# Altium footprint library LED.PcbLib: 60 footprints (part 3 of 4)
Each footprint in its own frame and in the unit in brackets; x right, y up, seen from the top. Pads: shape width x height; smd on the part's side, far side on the other; paste and mask are expansions set on the pad; w line width, h text height; cw(c..) or ccw(c..) is an arc to the next point about the centre after c.
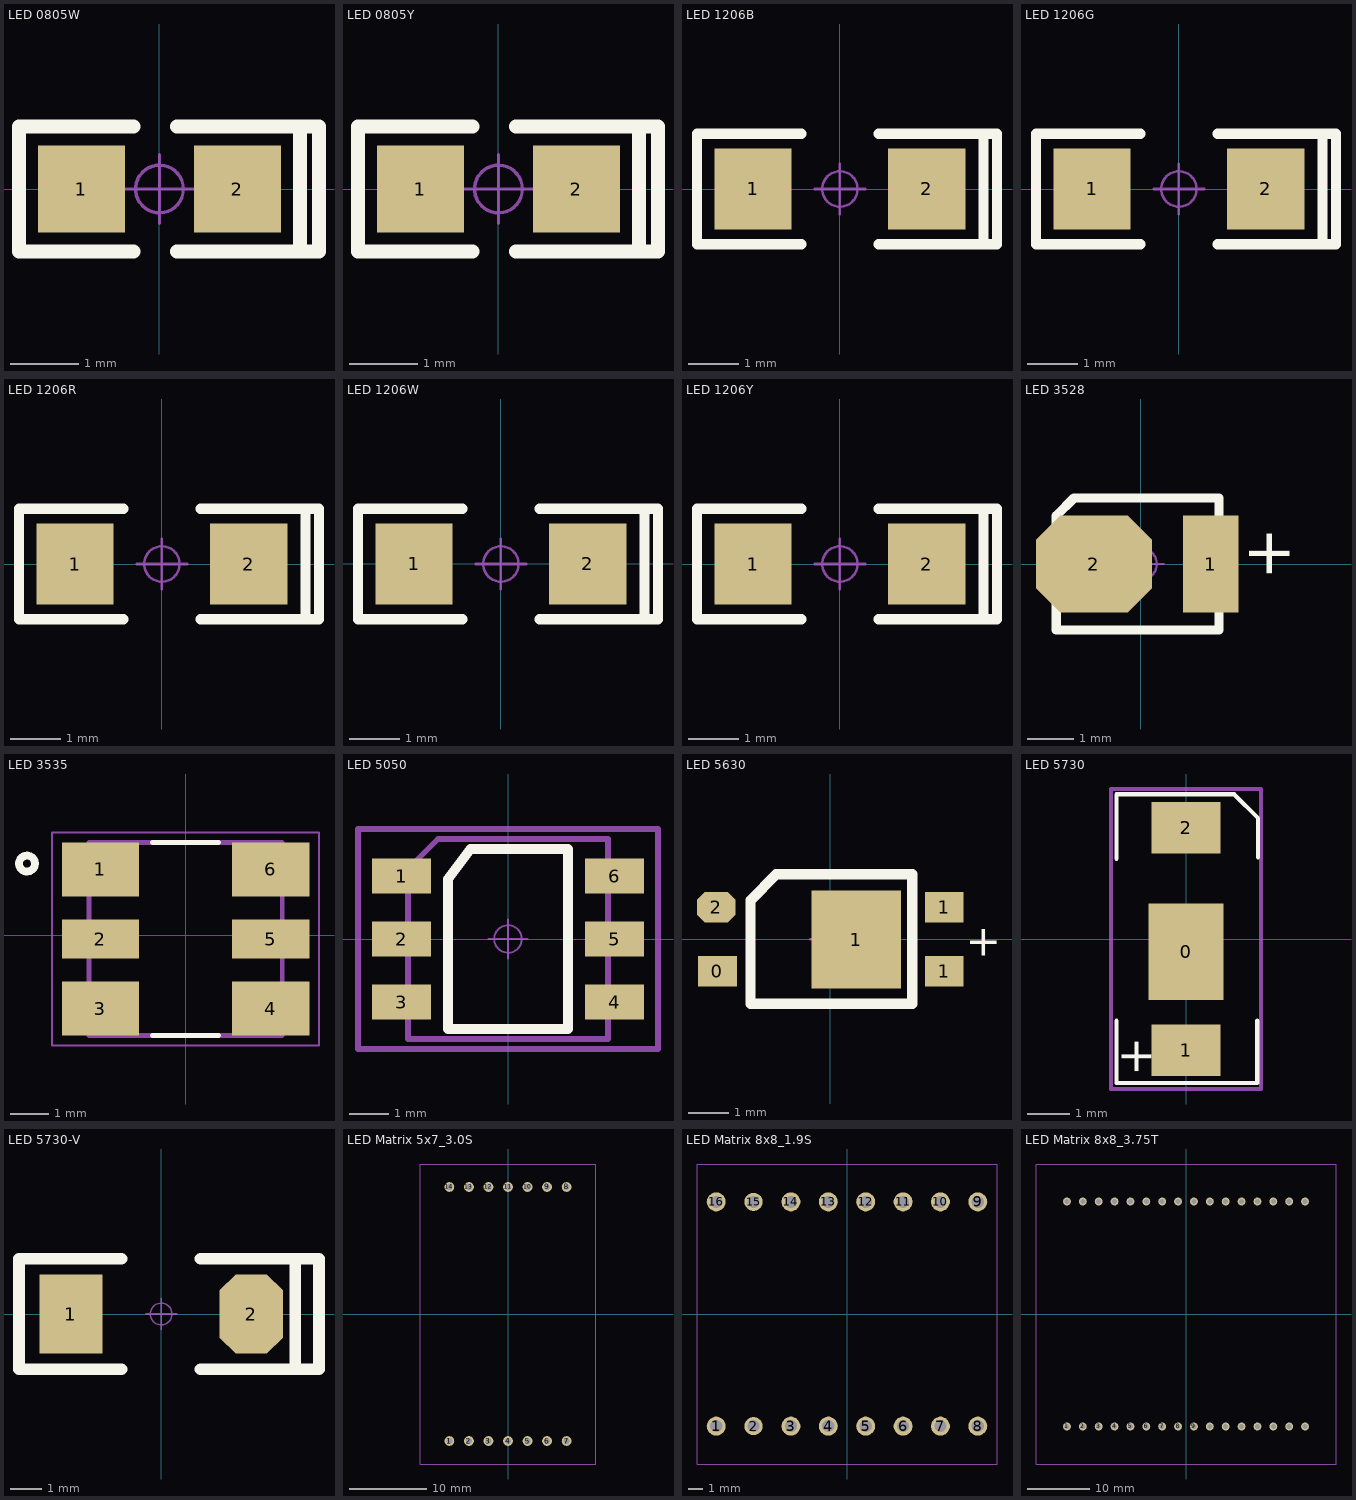
[diagram p2: the footprints below, top view; thin cyan lines are the x and y axes]

## LED 0805W [mil] "ï¿½ï¿½É«0805LED"
pads (2):
  rect 50x50 smd: 1(-45,0) 2(45,0)
Top Overlay:
  lines w8: -15,-36 -81,-36 -81,36 -15,36 ; 10.01,-35.99 80.01,-35.99 ; 10.01,36.01 80.01,36.01 ; 76.01,-35.99 92.01,-35.99 92.01,36.01 76.01,36.01 ; 81.01,-35.99 81.01,36.01
Mechanical 15:
  circle w1.97: c0,0 r13.78
  lines w1.97: -19.68,0 19.68,0 ; 0,-19.68 0,19.68
3D body "LED 0805������.STEP": height 31.69, standoff 12.01, extent -29.49,-24.65 29.49,24.65
3D body "LED 0805-W.STEP": height 26.33, standoff -0.16, extent -39.37,-24.65 39.37,24.64

## LED 0805Y [mil] "ï¿½ï¿½É«0805LED"
pads (2):
  rect 50x50 smd: 1(-45,0) 2(45,0)
Top Overlay:
  lines w8: -15,-36 -81,-36 -81,36 -15,36 ; 10,-36 80,-36 ; 10,36 80,36 ; 76,-36 92,-36 92,36 76,36 ; 81.01,-35.99 81.01,36.01
Mechanical 15:
  circle w1.97: c0,0 r13.78
  lines w1.97: -19.68,0 19.68,0 ; 0,-19.68 0,19.68
3D body "LED 0805������.STEP": height 31.69, standoff 12.01, extent -29.49,-24.65 29.49,24.65
3D body "LED 0805-Y.STEP": height 26.33, standoff -0.16, extent -39.37,-24.65 39.37,24.65

## LED 1206B [mil] "ï¿½ï¿½É«1206LED"
pads (2):
  rect 60x62.99 smd: 1(-67.5,0) 2(67.5,0)
Top Overlay:
  lines w8: -30,-43 -111,-43 -111,43 -109,43 -30,43 ; 30,-43 122,-43 122,43 30,43 ; 111.5,-43 111.5,43
Mechanical 15:
  circle w1.97: c0,0 r13.78
  lines w1.97: -19.68,0 19.68,0 ; 0,-19.68 0,19.68
3D body "LED 1206������.STEP": height 39.57, standoff 19.88, extent -44.33,-31.54 44.33,31.54
3D body "LED 1206-B.STEP": height 35.58, standoff -0.16, extent -63.03,-31.54 63.03,31.54

## LED 1206G [mil] "ï¿½ï¿½É«1206LED"
pads (2):
  rect 60x62.99 smd: 1(-67.5,0) 2(67.5,0)
Top Overlay:
  lines w8: -111,43 -111,-43 -30,-43 ; -109,43 -30,43 ; 30,-43 122,-43 122,43 30,43 ; 111.5,-43 111.5,43
Mechanical 15:
  circle w1.97: c0,0 r13.78
  lines w1.97: -19.68,0 19.68,0 ; 0,-19.68 0,19.68
3D body "LED 1206������.STEP": height 39.57, standoff 19.88, extent -44.33,-31.54 44.33,31.54
3D body "LED 1206-G.STEP": height 35.58, standoff -0.16, extent -63.03,-31.54 63.03,31.54

## LED 1206R [mil] "ï¿½ï¿½É«1206LED"
pads (2):
  rect 60x62.99 smd: 1(-67.5,0) 2(67.5,0)
Top Overlay:
  lines w8: -111.01,43 -111.01,-43 -30.01,-43 ; -109.01,43 -30.01,43 ; 30,-43 122,-43 122,43 30,43 ; 111.51,-43 111.51,43
Mechanical 15:
  circle w1.97: c0,0 r13.78
  lines w1.97: -19.68,0 19.68,0 ; 0,-19.68 0,19.68
3D body "LED 1206������.STEP": height 39.57, standoff 19.88, extent -44.33,-31.54 44.33,31.54
3D body "LED 1206-R.STEP": height 35.58, standoff -0.16, extent -63.03,-31.54 63.03,31.54

## LED 1206W [mil] "ï¿½ï¿½É«1206LED"
pads (2):
  rect 60x62.99 smd: 1(-67.5,0) 2(67.5,0)
Top Overlay:
  lines w8: -111.01,43 -111.01,-43 -30.01,-43 ; -109.01,43 -30.01,43 ; 30,-43 122,-43 122,43 30,43 ; 111.5,-43 111.5,43
Mechanical 15:
  circle w1.97: c0,0 r13.78
  lines w1.97: -19.68,0 19.68,0 ; 0,-19.68 0,19.68
3D body "LED 1206-W.STEP": height 35.58, standoff -0.16, extent -63.03,-31.54 63.03,31.54
3D body "LED 1206������.STEP": height 39.57, standoff 19.88, extent -44.33,-31.54 44.33,31.54

## LED 1206Y [mil] "ï¿½ï¿½É«1206LED"
pads (2):
  rect 60x62.99 smd: 1(-67.5,0) 2(67.5,0)
Top Overlay:
  lines w8: -111.01,43 -111.01,-43 -30.01,-43 ; -109.01,43 -30.01,43 ; 30,-43 122,-43 122,43 30,43 ; 111.51,-43 111.51,43
Mechanical 15:
  circle w1.97: c0,0 r13.78
  lines w1.97: -19.68,0 19.68,0 ; 0,-19.68 0,19.68
3D body "LED 1206-Y.STEP": height 35.58, standoff -0.16, extent -63.03,-31.54 63.03,31.54
3D body "LED 1206������.STEP": height 39.57, standoff 19.88, extent -44.33,-31.54 44.33,31.54

## LED 3528 [mm] "ï¿½ï¿½É«3528LED"
pads (2):
  rect 1.2x2.1 smd: 1(1.511,0)
  oct 2.5x2.1 smd: 2(-1.003,0)
Top Overlay:
  lines w0.2: -1.816,-1.422 1.689,-1.422 1.689,1.422 -1.435,1.422 -1.816,1.041 -1.816,-1.422
  text "+" at 3.213,-0.356 h1
Mechanical 15:
  circle w0.05: c0,0 r0.35
  lines w0.05: -0.5,0 0.5,0 ; 0,-0.5 0,0.5
3D body "LED 3528 ͸����.STEP": height 1.95, standoff 1.2, extent -1.195,-1.195 1.195,1.195
3D body "LED 3528 ����.STEP": height 1.95, standoff 0.05, extent -1.75,-1.4 1.75,1.4

## LED 3535 [mm]
pads (6):
  rect 2x1.4 smd: 1(-2.2,1.698) 3(-2.2,-1.902) 4(2.2,-1.902) 6(2.2,1.698)
  rect 2x1 smd: 2(-2.2,-0.102) 5(2.2,-0.102)
Top Overlay:
  circle w0.2: c-4.1,1.848 r0.206
  lines w0.127: -0.85,-2.602 0.85,-2.602 ; -0.85,2.398 0.85,2.398
Mechanical 13:
  lines w0.127: -2.5,-2.602 2.5,-2.602 2.5,2.398 -2.5,2.398 -2.5,-2.602
Mechanical 15:
  lines w0.05: -3.45,-2.852 3.45,-2.852 3.45,2.648 -3.45,2.648 -3.45,-2.852
3D body "QBLP679E-RGB--3DModel-STEP-56544.STEP": height 1.6, standoff 0, extent -2.7,-2.602 2.7,2.398

## LED 5050 [mm] "ï¿½ï¿½É«5050LED"
pads (6):
  rect 1.5x0.9 smd: 1(-2.705,1.6) 2(-2.705,0) 3(-2.705,-1.6) 4(2.705,-1.6) 5(2.705,0) 6(2.705,1.6)
Top Overlay:
  lines w0.254: -1.524,-2.286 -1.524,1.524 -0.953,2.286 1.524,2.286 1.524,-2.286 -1.524,-2.286
Mechanical 13:
  lines w0.15: -2.54,-2.54 -2.54,1.778 -1.778,2.54 2.54,2.54 2.54,-2.54 -2.54,-2.54
Mechanical 15:
  circle w0.05: c0,0 r0.35
  lines w0.05: -0.5,0 0.5,0 ; 0,-0.5 0,0.5
  lines w0.15: -3.81,-2.794 -3.81,2.794 3.81,2.794 3.81,-2.794 -3.81,-2.794
3D body "LED 5050 ����.STEP": height 1.65, standoff 0.05, extent -2.7,-2.5 2.7,2.5
3D body "LED 5050 ͸����.STEP": height 1.65, standoff 0.67, extent -1.995,-1.995 1.995,1.995

## LED 5630 [mm] "ï¿½ï¿½É«5630LED"
pads (5):
  rect 0.95x0.75 smd: 0(-2.769,-0.781) 1(2.794,-0.781) 1(2.794,0.781)
  rect 2.2x2.4 smd: 1(0.635,-0.006)
  oct 0.95x0.75 smd: 2(-2.794,0.781)
Top Overlay:
  lines w0.254: -1.956,-1.581 2.007,-1.581 2.007,1.594 -1.321,1.594 -1.956,0.959 -1.956,-1.581
  text "+" at 3.327,-0.4 h0.76
Mechanical 15:
  circle w0.05: c0,0 r0.35
  lines w0.05: -0.5,0 0.5,0 ; 0,-0.5 0,0.5
3D body "LED 5630 ����.STEP": height 0.95, standoff 0.05, extent -2.9,-1.5 2.9,1.5
3D body "LED 5630 ͸����.STEP": height 0.95, standoff 0.6, extent -2.395,-1.395 2.395,1.395

## LED 5730 [mm] "LED; 2 Leads"
pads (3):
  rect 1.75x2.25 smd: 0(0,-0.3)
  rect 1.6x1.2 smd: 1(0,-2.6) 2(0,2.6)
Top Overlay:
  lines w0.1: -1.62,-1.905 -1.62,-3.36 1.665,-3.36 1.665,-1.905 ; -1.62,1.875 -1.62,3.375 1.125,3.375 1.68,2.82 1.68,2.61 1.68,1.905
  text "+" at -0.8,-3.2 h0.8
Mechanical 15:
  lines w0.1: -0.25,0 0.25,0 ; 0,-0.25 0,0.25 ; -1.75,-3.5 1.75,-3.5 1.75,3.5 -1.75,3.5 -1.75,-3.5
3D body "User Library-LED-midPower.STEP": height 0.76, standoff 0, extent -1.5,-2.8 1.5,2.8

## LED 5730-V [mil] "ï¿½ï¿½É«5730LED"
pads (2):
  rect 80x100 smd: 1(-114.17,0)
  oct 80x100 smd: 2(114.17,0)
Top Overlay:
  lines w15: -50,-70 -180,-70 -180,70 -50,70 ; 50,-70 170,-70 ; 50,70 170,70 170,-70 ; 165,70 200,70 200,-70 170,-70
Mechanical 15:
  circle w1.97: c0,0 r13.78
  lines w1.97: -19.68,0 19.68,0 ; 0,-19.68 0,19.68
3D body "LED_UV5730.STEP": height 33.46, standoff 0, extent -112.21,-59.06 112.2,59.05

## LED Matrix 5x7_3.0S [mil]
pads (14):
  round 50 hole 32: 1(-300,-650) 2(-200,-650) 3(-100,-650) 4(0,-650) 5(100,-650) 6(200,-650) 7(300,-650) 8(300,650) 9(200,650) 10(100,650) 11(0,650) 12(-100,650) 13(-200,650) 14(-300,650)
Mechanical 14:
  lines w2: -448.82,-767.72 448.82,-767.72 448.82,767.72 -448.82,767.72 -448.82,-767.72

## LED Matrix 8x8_1.9S [mm]
pads (16):
  round 1.27 hole 0.813: 1(-8.75,-7.5) 3(-3.75,-7.5) 4(-1.25,-7.5) 5(1.25,-7.5) 6(3.75,-7.5) 7(6.25,-7.5) 8(8.75,-7.5) 9(8.75,7.5) 10(6.25,7.5) 11(3.75,7.5) 12(1.25,7.5) 13(-1.25,7.5) 14(-3.75,7.5) 16(-8.75,7.5)
  round 1.219 hole 0.813: 2(-6.25,-7.5) 15(-6.25,7.5)
Mechanical 14:
  lines w0.051: -10.033,-10.033 -10.033,10.033 10.033,10.033 10.033,-10.033 -10.033,-10.033
3D body "User Library-1_9mm matrix.STEP": height 6, standoff -5, extent -10,-10 10,10

## LED Matrix 8x8_3.75T [mil]
pads (32):
  round 50 hole 32: 1(-750,-708.66) 2(-650,-708.66) 3(-550,-708.66) 4(-450,-708.66) 5(-350,-708.66) 6(-250,-708.66) 7(-150,-708.66) 8(-50,-708.66) 9(50,-708.66) 10(150,-708.66) 11(250,-708.66) 12(350,-708.66) 13(450,-708.66) 14(550,-708.66) 15(650,-708.66) 16(750,-708.66) 17(750,708.66) 18(650,708.66) 19(550,708.66) 20(450,708.66) 21(350,708.66) 22(250,708.66) 23(150,708.66) 24(50,708.66) 25(-50,708.66) 26(-150,708.66) 27(-250,708.66) 28(-350,708.66) 29(-450,708.66) 30(-550,708.66) 31(-650,708.66) 32(-750,708.66)
Mechanical 14:
  lines w2: -944.88,-944.88 944.88,-944.88 944.88,944.88 -944.88,944.88 -944.88,-944.88
Mechanical 15:
  lines w2: -750,708.66 -750,717.32 ; 750,-717.32 750,-708.66